# Altium footprint library LimeMicroAltiumLib_pcbLib_r05.PcbLib: 746 footprints (part 26 of 48)
Each footprint in its own frame and in the unit in brackets; x right, y up, seen from the top. Pads: shape width x height; smd on the part's side, far side on the other; paste and mask are expansions set on the pad; w line width, h text height; cw(c..) or ccw(c..) is an arc to the next point about the centre after c.
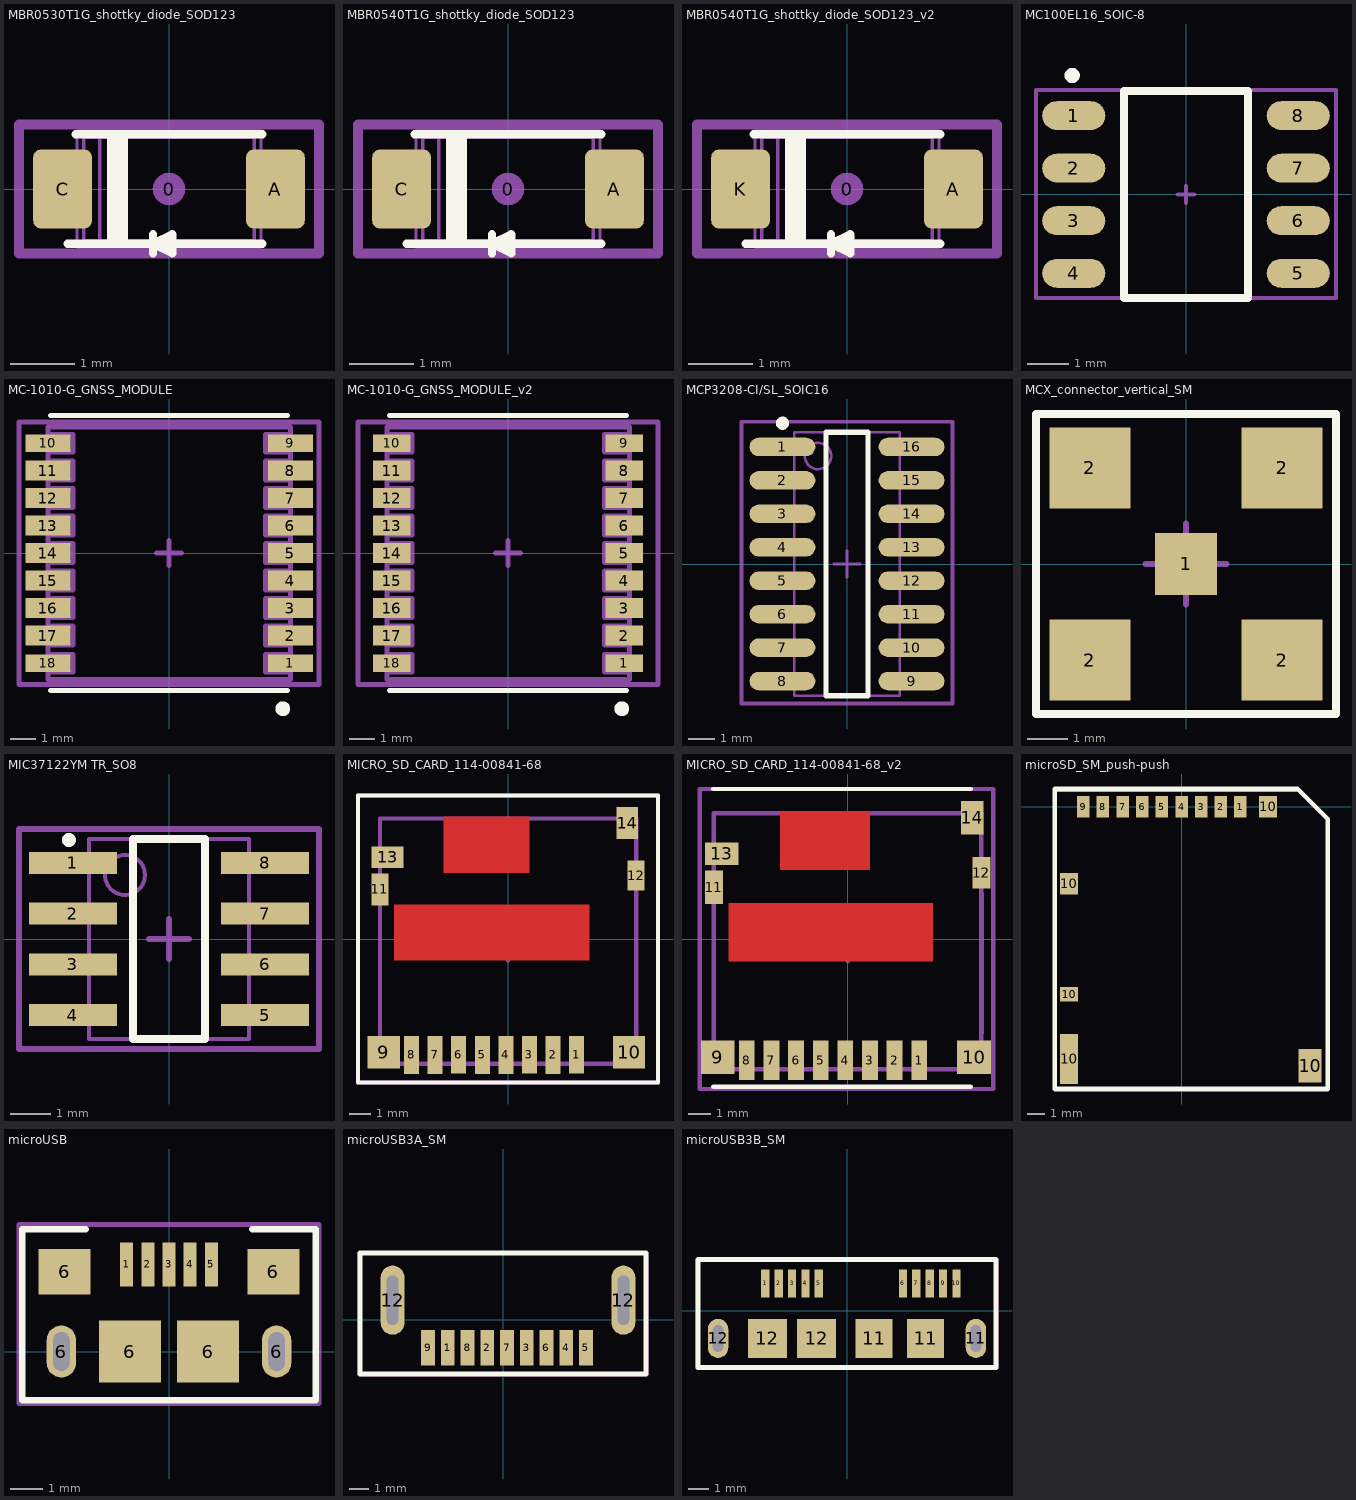
[diagram p25: the footprints below, top view; thin cyan lines are the x and y axes]

## MBR0530T1G_shottky_diode_SOD123 [mm]
height 1.15
pads (3):
  round 0.508 on Mech15: 0(0,0)
  rrect25% 0.91x1.22 smd: A(1.65,0) C(-1.65,0)
Top Overlay:
  lines w0.127: -1.575,-0.85 1.448,-0.85 ; -1.45,0.85 1.45,0.85 ; -0.9,-0.85 -0.9,0.85 ; -0.8,-0.85 -0.8,0.85 ; -0.7,-0.85 -0.7,0.85 ; -0.25,-1 -0.25,-0.7 ; 0.05,-0.85 -0.25,-0.85 ; -0.25,-0.85 0.05,-0.7 0.05,-1 -0.25,-0.85
Mechanical 13:
  lines w0.05: -1.766,-0.308 -1.766,0.308 ; -1.707,-0.308 -1.707,0.308 ; -1.517,-0.308 -1.517,0.308 ; -1.425,-0.308 -1.95,-0.308 -1.95,0.308 -1.425,0.308 ; 0.075,-0.9 0.177,-0.798 ; 1.425,-0.308 1.95,-0.308 1.95,0.308 1.425,0.308 ; 1.517,-0.308 1.517,0.308 ; 1.707,-0.308 1.707,0.308 ; 1.766,-0.308 1.766,0.308 ; -1.425,0.9 -1.425,-0.9 1.425,-0.9 ; -1.425,0.9 1.425,0.9 ; -1.425,0.9 -1.323,0.798 ; -1.323,0.798 -1.323,-0.798 -1.072,-0.798 ; -1.323,0.798 -1.072,0.798 ; -1.072,-0.798 -1.072,0.798 ; -1.072,-0.798 1.322,-0.797 ; -1.072,0.798 1.322,0.797 ; 1.322,-0.797 1.425,-0.9 ; 1.322,-0.797 1.322,0.797 ; 1.322,0.797 1.425,0.9 ; 1.425,-0.9 1.425,0.9
Mechanical 15:
  lines w0.15: -2.325,-1 -2.325,1 2.325,1 2.325,-1 -2.325,-1
  text ".Designator" at 0,0 h0.55
  text "C" at -1.9,-0.275 h0.55
  text "A" at 1.475,-0.275 h0.55
3D body "SOD123.STEP": height 1.18, standoff 0, extent -1.95,-0.9 1.95,0.9

## MBR0540T1G_shottky_diode_SOD123 [mm]
height 1.15
pads (3):
  round 0.508 on Mech15: 0(0,0)
  rrect25% 0.91x1.22 smd: A(1.65,0) C(-1.65,0)
Top Overlay:
  lines w0.127: -1.575,-0.85 1.448,-0.85 ; -1.45,0.85 1.45,0.85 ; -0.9,-0.85 -0.9,0.85 ; -0.8,-0.85 -0.8,0.85 ; -0.7,-0.85 -0.7,0.85 ; -0.25,-1 -0.25,-0.7 ; 0.05,-0.85 -0.25,-0.85 ; -0.25,-0.85 0.05,-0.7 0.05,-1 -0.25,-0.85
Mechanical 13:
  lines w0.05: -1.766,-0.308 -1.766,0.308 ; -1.707,-0.308 -1.707,0.308 ; -1.517,-0.308 -1.517,0.308 ; -1.425,-0.308 -1.95,-0.308 -1.95,0.308 -1.425,0.308 ; 0.075,-0.9 0.177,-0.798 ; 1.425,-0.308 1.95,-0.308 1.95,0.308 1.425,0.308 ; 1.517,-0.308 1.517,0.308 ; 1.707,-0.308 1.707,0.308 ; 1.766,-0.308 1.766,0.308 ; -1.425,0.9 -1.425,-0.9 1.425,-0.9 ; -1.425,0.9 1.425,0.9 ; -1.425,0.9 -1.323,0.798 ; -1.323,0.798 -1.323,-0.798 -1.072,-0.798 ; -1.323,0.798 -1.072,0.798 ; -1.072,-0.798 -1.072,0.798 ; -1.072,-0.798 1.322,-0.797 ; -1.072,0.798 1.322,0.797 ; 1.322,-0.797 1.425,-0.9 ; 1.322,-0.797 1.322,0.797 ; 1.322,0.797 1.425,0.9 ; 1.425,-0.9 1.425,0.9
Mechanical 15:
  lines w0.15: -2.325,-1 -2.325,1 2.325,1 2.325,-1 -2.325,-1
  text ".Designator" at 0,0 h0.55
  text "C" at -1.9,-0.275 h0.55
  text "A" at 1.475,-0.275 h0.55
3D body "SOD123.STEP": height 1.18, standoff 0, extent -1.95,-0.9 1.95,0.9

## MBR0540T1G_shottky_diode_SOD123_v2 [mm]
height 1.15
pads (3):
  round 0.508 on Mech15: 0(0,0)
  rrect25% 0.91x1.22 smd: A(1.65,0) K(-1.65,0)
Top Overlay:
  lines w0.127: -1.575,-0.85 1.448,-0.85 ; -1.45,0.85 1.45,0.85 ; -0.9,-0.85 -0.9,0.85 ; -0.8,-0.85 -0.8,0.85 ; -0.7,-0.85 -0.7,0.85 ; -0.25,-1 -0.25,-0.7 ; 0.05,-0.85 -0.25,-0.85 ; -0.25,-0.85 0.05,-1 0.05,-0.7 -0.25,-0.85
Mechanical 13:
  lines w0.05: -1.766,-0.308 -1.766,0.308 ; -1.707,-0.308 -1.707,0.308 ; -1.517,-0.308 -1.517,0.308 ; -1.425,-0.308 -1.95,-0.308 -1.95,0.308 -1.425,0.308 ; 0.075,-0.9 0.177,-0.798 ; 1.425,-0.308 1.95,-0.308 1.95,0.308 1.425,0.308 ; 1.517,-0.308 1.517,0.308 ; 1.707,-0.308 1.707,0.308 ; 1.766,-0.308 1.766,0.308 ; -1.425,0.9 -1.323,0.798 ; -1.425,0.9 1.425,0.9 ; -1.425,0.9 -1.425,-0.9 1.425,-0.9 ; -1.323,0.798 -1.072,0.798 ; -1.323,0.798 -1.323,-0.798 -1.072,-0.798 ; -1.072,-0.798 1.322,-0.797 ; -1.072,-0.798 -1.072,0.798 ; -1.072,0.798 1.322,0.797 ; 1.322,-0.797 1.322,0.797 ; 1.322,-0.797 1.425,-0.9 ; 1.322,0.797 1.425,0.9 ; 1.425,-0.9 1.425,0.9
Mechanical 15:
  lines w0.15: -2.325,-1 2.325,-1 2.325,1 -2.325,1 -2.325,-1
  text "A" at 1.475,-0.275 h0.55
  text "C" at -1.9,-0.275 h0.55
  text ".Designator" at 0,0 h0.55
3D body "SOD123.STEP": height 1.18, standoff 0, extent -1.95,-0.9 1.95,0.9

## MC100EL16_SOIC-8 [mm]
pads (8):
  oval 1.525x0.7 smd mask+0.05: 1(-2.712,1.905) 2(-2.712,0.635) 3(-2.712,-0.635) 4(-2.712,-1.905) 5(2.712,-1.905) 6(2.712,-0.635) 7(2.712,0.635) 8(2.712,1.905)
Top Overlay:
  circle w0.254: c-2.75,2.875 r0.056
  lines w0.2: -1.5,-2.5 1.5,-2.5 1.5,2.5 -1.5,2.5 -1.5,-2.5
Mechanical 15:
  circle w0.254: c-2.675,1.9 r0.071
  lines w0.1: -0.2,0 0,0 ; 0,-0.2 0,0 ; 0,0.2 0,0 ; 0.2,0 0,0 ; -3.625,-2.5 3.625,-2.5 3.625,2.525 -3.625,2.525 -3.625,-2.5
  text ".Designator" at 0,0 h0.55
3D body "MC100EL16DG.stp": height 1.75, standoff 0, extent -3,-2.45 3,2.45

## MC-1010-G_GNSS_MODULE [mm]
pads (18):
  rect 1.8x0.7 smd mask+0.05: 1(4.85,-4.4) 9(4.85,4.4) 10(-4.85,4.4) 18(-4.85,-4.4)
  rect 1.8x0.8 smd mask+0.05: 2(4.85,-3.3) 3(4.85,-2.2) 4(4.85,-1.1) 5(4.85,0) 6(4.85,1.1) 7(4.85,2.2) 8(4.85,3.3) 11(-4.85,3.3) 12(-4.85,2.2) 13(-4.85,1.1) 14(-4.85,0) 15(-4.85,-1.1) 16(-4.85,-2.2) 17(-4.85,-3.3)
Top Overlay:
  circle w0.3: c4.55,-6.225 r0.146
  lines w0.2: -4.75,-5.5 4.75,-5.5 ; -4.75,5.5 4.75,5.5
Mechanical 13:
  lines w0.2: -4.534,-4.434 cw(c-4.85,-4.434) -4.85,-4.75 -3.85,-4.75 -3.85,-4.05 -4.85,-4.05 cw(c-4.85,-4.366) -4.534,-4.366 ; -4.534,4.366 cw(c-4.85,4.366) -4.85,4.05 -3.85,4.05 -3.85,4.75 -4.85,4.75 cw(c-4.85,4.434) -4.534,4.434 ; 4.534,-4.434 ccw(c4.85,-4.434) 4.85,-4.75 3.85,-4.75 3.85,-4.05 4.85,-4.05 ccw(c4.85,-4.366) 4.534,-4.366 ; 4.534,4.366 ccw(c4.85,4.366) 4.85,4.05 3.85,4.05 3.85,4.75 4.85,4.75 ccw(c4.85,4.434) 4.534,4.434 ; -4.85,-5.05 4.85,-5.05 4.85,5.05 -4.85,5.05 -4.85,-5.05 ; -4.85,-3.675 ccw(c-4.85,-3.359) -4.534,-3.359 -4.534,-3.241 ccw(c-4.85,-3.241) -4.85,-2.925 -3.85,-2.925 -3.85,-3.675 -4.85,-3.675 ; -4.85,-2.575 ccw(c-4.85,-2.259) -4.534,-2.259 -4.534,-2.141 ccw(c-4.85,-2.141) -4.85,-1.825 -3.85,-1.825 -3.85,-2.575 -4.85,-2.575 ; -4.85,-1.475 ccw(c-4.85,-1.159) -4.534,-1.159 -4.534,-1.041 ccw(c-4.85,-1.041) -4.85,-0.725 -3.85,-0.725 -3.85,-1.475 -4.85,-1.475 ; -4.85,-0.375 ccw(c-4.85,-0.059) -4.534,-0.059 -4.534,0.059 ccw(c-4.85,0.059) -4.85,0.375 -3.85,0.375 -3.85,-0.375 -4.85,-0.375 ; -4.85,0.725 ccw(c-4.85,1.041) -4.534,1.041 -4.534,1.159 ccw(c-4.85,1.159) -4.85,1.475 -3.85,1.475 -3.85,0.725 -4.85,0.725 ; -4.85,1.825 ccw(c-4.85,2.141) -4.534,2.141 -4.534,2.259 ccw(c-4.85,2.259) -4.85,2.575 -3.85,2.575 -3.85,1.825 -4.85,1.825 ; -4.85,2.925 ccw(c-4.85,3.241) -4.534,3.241 -4.534,3.359 ccw(c-4.85,3.359) -4.85,3.675 -3.85,3.675 -3.85,2.925 -4.85,2.925 ; 3.85,-3.675 3.85,-2.925 4.85,-2.925 ccw(c4.85,-3.241) 4.534,-3.241 4.534,-3.359 ccw(c4.85,-3.359) 4.85,-3.675 3.85,-3.675 ; 3.85,-2.575 4.85,-2.575 cw(c4.85,-2.259) 4.534,-2.259 4.534,-2.141 cw(c4.85,-2.141) 4.85,-1.825 3.85,-1.825 3.85,-2.575 ; 3.85,-1.475 4.85,-1.475 cw(c4.85,-1.159) 4.534,-1.159 4.534,-1.041 cw(c4.85,-1.041) 4.85,-0.725 3.85,-0.725 3.85,-1.475 ; 3.85,-0.375 4.85,-0.375 cw(c4.85,-0.059) 4.534,-0.059 4.534,0.059 cw(c4.85,0.059) 4.85,0.375 3.85,0.375 3.85,-0.375 ; 3.85,0.725 3.85,1.475 4.85,1.475 ccw(c4.85,1.159) 4.534,1.159 4.534,1.041 ccw(c4.85,1.041) 4.85,0.725 3.85,0.725 ; 3.85,1.825 3.85,2.575 4.85,2.575 ccw(c4.85,2.259) 4.534,2.259 4.534,2.141 ccw(c4.85,2.141) 4.85,1.825 3.85,1.825 ; 3.85,2.925 4.85,2.925 cw(c4.85,3.241) 4.534,3.241 4.534,3.359 cw(c4.85,3.359) 4.85,3.675 3.85,3.675 3.85,2.925
Mechanical 15:
  lines w0.2: -0.5,0 0.5,0 ; 0,-0.5 0,0.5 ; -6,-5.25 -6,5.25 6,5.25 6,-5.25 -6,-5.25
  text ".Designator" at 0,0 h0.55
  text "1" at 4.75,-4.75 h0.55
  text "9" at 4.75,4.25 h0.55
  text "10" at -5.25,4.25 h0.55
  text "18" at -5.25,-4.75 h0.55
3D body: height 2, standoff 0, extent -4.85,-5.05 4.85,5.05

## MC-1010-G_GNSS_MODULE_v2 [mm]
pads (18):
  rect 1.5x0.7 smd mask+0.05: 1(4.65,-4.4) 9(4.65,4.4) 10(-4.65,4.4) 18(-4.65,-4.4)
  rect 1.5x0.8 smd mask+0.05: 2(4.65,-3.3) 3(4.65,-2.2) 4(4.65,-1.1) 5(4.65,0) 6(4.65,1.1) 7(4.65,2.2) 8(4.65,3.3) 11(-4.65,3.3) 12(-4.65,2.2) 13(-4.65,1.1) 14(-4.65,0) 15(-4.65,-1.1) 16(-4.65,-2.2) 17(-4.65,-3.3)
Top Overlay:
  circle w0.3: c4.55,-6.225 r0.146
  lines w0.2: -4.75,-5.5 4.75,-5.5 ; -4.75,5.5 4.75,5.5
Mechanical 13:
  lines w0.2: -4.534,-4.434 cw(c-4.85,-4.434) -4.85,-4.75 -3.85,-4.75 -3.85,-4.05 -4.85,-4.05 cw(c-4.85,-4.366) -4.534,-4.366 ; -4.534,4.366 cw(c-4.85,4.366) -4.85,4.05 -3.85,4.05 -3.85,4.75 -4.85,4.75 cw(c-4.85,4.434) -4.534,4.434 ; 4.534,-4.434 ccw(c4.85,-4.434) 4.85,-4.75 3.85,-4.75 3.85,-4.05 4.85,-4.05 ccw(c4.85,-4.366) 4.534,-4.366 ; 4.534,4.366 ccw(c4.85,4.366) 4.85,4.05 3.85,4.05 3.85,4.75 4.85,4.75 ccw(c4.85,4.434) 4.534,4.434 ; -4.85,-5.05 4.85,-5.05 4.85,5.05 -4.85,5.05 -4.85,-5.05 ; -4.85,-3.675 ccw(c-4.85,-3.359) -4.534,-3.359 -4.534,-3.241 ccw(c-4.85,-3.241) -4.85,-2.925 -3.85,-2.925 -3.85,-3.675 -4.85,-3.675 ; -4.85,-2.575 ccw(c-4.85,-2.259) -4.534,-2.259 -4.534,-2.141 ccw(c-4.85,-2.141) -4.85,-1.825 -3.85,-1.825 -3.85,-2.575 -4.85,-2.575 ; -4.85,-1.475 ccw(c-4.85,-1.159) -4.534,-1.159 -4.534,-1.041 ccw(c-4.85,-1.041) -4.85,-0.725 -3.85,-0.725 -3.85,-1.475 -4.85,-1.475 ; -4.85,-0.375 ccw(c-4.85,-0.059) -4.534,-0.059 -4.534,0.059 ccw(c-4.85,0.059) -4.85,0.375 -3.85,0.375 -3.85,-0.375 -4.85,-0.375 ; -4.85,0.725 ccw(c-4.85,1.041) -4.534,1.041 -4.534,1.159 ccw(c-4.85,1.159) -4.85,1.475 -3.85,1.475 -3.85,0.725 -4.85,0.725 ; -4.85,1.825 ccw(c-4.85,2.141) -4.534,2.141 -4.534,2.259 ccw(c-4.85,2.259) -4.85,2.575 -3.85,2.575 -3.85,1.825 -4.85,1.825 ; -4.85,2.925 ccw(c-4.85,3.241) -4.534,3.241 -4.534,3.359 ccw(c-4.85,3.359) -4.85,3.675 -3.85,3.675 -3.85,2.925 -4.85,2.925 ; 3.85,-3.675 3.85,-2.925 4.85,-2.925 ccw(c4.85,-3.241) 4.534,-3.241 4.534,-3.359 ccw(c4.85,-3.359) 4.85,-3.675 3.85,-3.675 ; 3.85,-2.575 4.85,-2.575 cw(c4.85,-2.259) 4.534,-2.259 4.534,-2.141 cw(c4.85,-2.141) 4.85,-1.825 3.85,-1.825 3.85,-2.575 ; 3.85,-1.475 4.85,-1.475 cw(c4.85,-1.159) 4.534,-1.159 4.534,-1.041 cw(c4.85,-1.041) 4.85,-0.725 3.85,-0.725 3.85,-1.475 ; 3.85,-0.375 4.85,-0.375 cw(c4.85,-0.059) 4.534,-0.059 4.534,0.059 cw(c4.85,0.059) 4.85,0.375 3.85,0.375 3.85,-0.375 ; 3.85,0.725 3.85,1.475 4.85,1.475 ccw(c4.85,1.159) 4.534,1.159 4.534,1.041 ccw(c4.85,1.041) 4.85,0.725 3.85,0.725 ; 3.85,1.825 3.85,2.575 4.85,2.575 ccw(c4.85,2.259) 4.534,2.259 4.534,2.141 ccw(c4.85,2.141) 4.85,1.825 3.85,1.825 ; 3.85,2.925 4.85,2.925 cw(c4.85,3.241) 4.534,3.241 4.534,3.359 cw(c4.85,3.359) 4.85,3.675 3.85,3.675 3.85,2.925
Mechanical 15:
  lines w0.2: -0.5,0 0.5,0 ; 0,-0.5 0,0.5 ; -6,-5.25 -6,5.25 6,5.25 6,-5.25 -6,-5.25
  text ".Designator" at 0,0 h0.55
  text "1" at 4.75,-4.75 h0.55
  text "9" at 4.75,4.25 h0.55
  text "10" at -5.25,4.25 h0.55
  text "18" at -5.25,-4.75 h0.55
3D body: height 2, standoff 0, extent -4.85,-5.05 4.85,5.05

## MCP3208-CI/SL_SOIC16 [mm] "SOIC, 16-Leads, Body 9.9x3.9mm, Pitch 1.27mm, IPC Low Density"
height 1.75
pads (16):
  oval 2.5x0.7 smd: 1(-2.45,4.445) 2(-2.45,3.175) 3(-2.45,1.905) 4(-2.45,0.635) 5(-2.45,-0.635) 6(-2.45,-1.905) 7(-2.45,-3.175) 8(-2.45,-4.445) 9(2.45,-4.445) 10(2.45,-3.175) 11(2.45,-1.905) 12(2.45,-0.635) 13(2.45,0.635) 14(2.45,1.905) 15(2.45,3.175) 16(2.45,4.445)
Top Overlay:
  circle w0.25: c-2.45,5.345 r0.125
  lines w0.2: -0.8,-5 0.8,-5 0.8,5 -0.8,5 -0.8,-5
Mechanical 13:
  circle w0.1: c-1.1,4.1 r0.5
  lines w0.1: -2,-5 2,-5 2,5 -2,5 -2,-5
Mechanical 15:
  circle w0.2: c-2.5,4.5 r0.09
  lines w0.1: -0.5,0 0.5,0 ; 0,-0.5 0,0.5
  lines w0.15: -4,-5.3 4,-5.3 4,5.4 -4,5.4 -4,-5.3
  text ".Designator" at 0,0 h0.55
3D body "User Library-SOIC-16-1.step": height 1.4, standoff 0, extent -3,-4.95 3,4.95

## MCX_connector_vertical_SM [mm]
pads (5):
  rect 1.52x1.52 smd: 1(0,0)
  rect 2x2 smd: 2(-2.37,-2.37) 2(-2.37,2.37) 2(2.37,-2.37) 2(2.37,2.37)
Top Overlay:
  lines w0.2: -3.7,-3.7 -3.7,3.7 3.7,3.7 3.7,-3.7 -3.7,-3.7
Mechanical 15:
  lines w0.15: -1,0 0,0 ; 0,-1 0,0 ; 0,1 0,0 ; 1,0 0,0 ; -3.7,-3.7 3.7,-3.7 3.7,3.7 -3.7,3.7 -3.7,-3.7
  text ".Designator" at 0,0 h0.55
3D body "User Library-MCX_SMD_v1.step": height 5.9, standoff 0, extent -2.95,-2.95 2.95,2.95

## MECH_JUMPER_HALF_PITCH [mm]
3D body "User Library-PinHeader50mil.STEP": height 7.3, standoff 1.8, extent -1.25,-0.575 1.25,0.625

## MIC37122YM TR_SO8 [mm] "SOIC, 8-Leads, Body 4,90x3,90mm, Pitch 1,27mm, IPC Medium Density"
height 1.7
pads (8):
  rect 2.2x0.55 smd: 1(-2.4,1.905) 2(-2.4,0.635) 3(-2.4,-0.635) 4(-2.4,-1.905) 5(2.4,-1.905) 6(2.4,-0.635) 7(2.4,0.635) 8(2.4,1.905)
Top Overlay:
  circle w0.25: c-2.5,2.475 r0.05
  lines w0.2: -0.9,-2.5 0.9,-2.5 0.9,2.5 -0.9,2.5 -0.9,-2.5
Mechanical 13:
  circle w0.1: c-1.1,1.6 r0.5
  lines w0.1: -2,-2.5 2,-2.5 2,2.5 -2,2.5 -2,-2.5
Mechanical 15:
  circle w0.35: c-2.8,1.9 r0.1
  lines w0.15: -0.5,0 0.5,0 ; 0,-0.5 0,0.5 ; -3.75,-2.75 3.75,-2.75 3.75,2.75 -3.75,2.75 -3.75,-2.75
  text ".Designator" at 0,0 h0.55
3D body "CircuitWorks-SO-8.step": height 1.45, standoff 0, extent -2.889,-2.45 2.889,2.452

## MICRO_SD_CARD_114-00841-68 [mm]
pads (14):
  rect 0.7x1.75 smd mask+0.1: 1(3.2,-5.412) 6(-2.3,-5.412)
  rect 0.701x1.753 smd mask+0.1: 2(2.1,-5.412) 8(-4.5,-5.412)
  rect 0.701x1.752 smd mask+0.1: 3(1,-5.412) 4(-0.1,-5.412) 5(-1.2,-5.412) 7(-3.4,-5.412)
  rect 1.501x1.501 smd mask+0.1: 9(-5.8,-5.288)
  rect 1.502x1.502 smd mask+0.1: 10(5.65,-5.288)
  rect 0.801x1.501 smd mask+0.1: 11(-5.975,2.312)
  rect 0.8x1.401 smd mask+0.1: 12(5.975,2.963)
  rect 1.5x1 smd mask+0.1: 13(-5.62,3.812)
  rect 1.001x1.502 smd mask+0.1: 14(5.575,5.413)
Top Layer:
  pour cut-out: 1,3.1 -3,3.1 -3,5.7 1,5.7
  pour cut-out: 3.8,-1 -5.3,-1 -5.3,1.6 3.8,1.6
Top Overlay:
  lines w0.2: -7,-6.7 7,-6.7 7,6.7 -7,6.7 -7,-6.7
Top Solder:
  region: -6.475,3.15 -6.475,4.425 -4.75,4.425 -4.75,3.2 -5.475,3.2 -5.475,3.15
Mechanical 13:
  lines w0.2: -5.975,-5.841 -5.975,5.626 ; -5.975,-5.826 5.976,-5.826 ; -5.975,-4.145 -5.975,-0.109 ; -5.975,-0.104 -5.975,1.237 ; 4.656,5.626 -5.975,5.626 ; 5.982,-5.831 5.982,5.626 ; 5.985,-4.215 5.985,-0.104 ; 5.988,-0.105 5.988,2.043 ; 5.988,5.626 -5.975,5.626
Mechanical 15:
  lines w0.2: -1,0 0,0 ; 0,-1 0,0 ; 0,1 0,0 ; 1,0 0,0 ; -7,-6.7 7,-6.7 7,6.7 -7,6.7 -7,-6.7
  text "8" at -4.6,-4.4 h0.55
  text "1" at 3.1,-4.4 h0.55
  text ".Designator" at 0,0 h0.55
3D body "User Library-Micro_SD.step": height 1.45, standoff 0.47, extent -5.5,-9.9 5.5,5.1
3D body "User Library-Micro SD Holder 114-00841-68.step": height 1.6, standoff 0, extent -6,-5.85 6,5.75

## MICRO_SD_CARD_114-00841-68_v2 [mm]
pads (14):
  rect 0.7x1.75 smd mask+0.1: 1(3.2,-5.412) 6(-2.3,-5.412)
  rect 0.701x1.753 smd mask+0.1: 2(2.1,-5.412) 8(-4.5,-5.412)
  rect 0.701x1.752 smd mask+0.1: 3(1,-5.412) 4(-0.1,-5.412) 5(-1.2,-5.412) 7(-3.4,-5.412)
  rect 1.501x1.501 smd mask+0.1: 9(-5.8,-5.288)
  rect 1.502x1.502 smd mask+0.1: 10(5.65,-5.288)
  rect 0.801x1.501 smd mask+0.1: 11(-5.975,2.312)
  rect 0.8x1.401 smd mask+0.1: 12(5.975,2.963)
  rect 1.5x1 smd mask+0.1: 13(-5.62,3.812)
  rect 1.001x1.502 smd mask+0.1: 14(5.575,5.413)
Top Layer:
  pour cut-out: 1,3.1 -3,3.1 -3,5.7 1,5.7
  pour cut-out: 3.8,-1 -5.3,-1 -5.3,1.6 3.8,1.6
Top Overlay:
  lines w0.2: -6,-6.6 5.5,-6.6 ; -6,6.7 5.5,6.7
Top Solder:
  region: -6.475,3.15 -6.475,4.425 -4.75,4.425 -4.75,3.2 -5.475,3.2 -5.475,3.15
Mechanical 13:
  lines w0.2: -5.975,-5.841 -5.975,5.626 ; -5.975,-5.826 5.976,-5.826 ; -5.975,-4.145 -5.975,-0.109 ; -5.975,-0.104 -5.975,1.237 ; 4.656,5.626 -5.975,5.626 ; 5.982,-5.831 5.982,5.626 ; 5.985,-4.215 5.985,-0.104 ; 5.988,-0.105 5.988,2.043 ; 5.988,5.626 -5.975,5.626
Mechanical 15:
  lines w0.2: -1,0 0,0 ; 0,-1 0,0 ; 0,1 0,0 ; 1,0 0,0 ; -6.6,-6.7 -6.6,6.7 6.5,6.7 6.5,-6.7 -6.6,-6.7
  text "8" at -4.6,-4.4 h0.55
  text "1" at 3.1,-4.4 h0.55
  text ".Designator" at 0,0 h0.55
3D body "User Library-Micro_SD.step": height 1.45, standoff 0.47, extent -5.5,-9.9 5.5,5.1
3D body "User Library-Micro SD Holder 114-00841-68.step": height 1.6, standoff 0, extent -6,-5.85 6,5.75

## microSD_SM_push-push [mm]
pads (14):
  rect 0.7x1.2 smd: 1(3.3,0) 2(2.2,0) 3(1.1,0) 4(0,0) 5(-1.1,0) 6(-2.2,0) 7(-3.3,0) 8(-4.4,0) 9(-5.5,0)
  rect 1x2.8 smd: 10(-6.3,-14.11)
  rect 1x0.8 smd: 10(-6.3,-10.5)
  rect 1x1.2 smd: 10(-6.3,-4.3) 10(4.85,0)
  rect 1.3x1.9 smd: 10(7.2,-14.5)
Top Overlay:
  lines w0.254: -7.1,-15.8 -7.1,1 6.5,1 8.2,-0.7 8.2,-15.8 -7.1,-15.8
Mechanical 15:
  lines w0.15: -7.1,-15.8 -7.1,1 -7,0.9 6.625,0.9 8.2,-0.675 8.2,-15.8 -7.1,-15.8
  text ".Designator" at 0.4,-8.1 h0.55
3D body "DM3AT-SF-PEJM5.stp": height 1.68, standoff 0, extent -6.425,-16.1 7.425,0.05
3D body "User Library-Micro_SD.step": height 1.45, standoff 0.47, extent -5.5,-17.3 5.5,-2.3

## microUSB [mm]
pads (11):
  rect 0.4x1.35 smd mask+0.05: 1(-1.3,2.675) 2(-0.65,2.675) 3(0,2.675) 4(0.65,2.675) 5(1.3,2.675)
  oval 0.9x1.6 hole 0.5 slot 1.2 at 90 deg: 6(-3.3,0) 6(3.3,0)
  rect 1.6x1.4 smd: 6(-3.2,2.45) 6(3.2,2.45)
  rect 1.9x1.9 smd: 6(-1.2,0) 6(1.2,0)
Top Overlay:
  lines w0.2: -2.55,3.75 -4.5,3.75 -4.5,-1.5 4.5,-1.5 4.5,3.75 2.55,3.75
Mechanical 15:
  lines w0.15: -4.6,-1.6 -4.6,3.9 4.6,3.9 4.6,-1.6 -4.6,-1.6
  text ".Designator" at 0,1.3 h0.55
3D body "USB3090-30-A_revE.step": height 2.59, standoff -1, extent -3.891,-2.565 3.892,2.925

## microUSB3A_SM [mm]
pads (11):
  rect 0.7x1.8 smd: 1(-2.8,-1.4) 2(-0.8,-1.4) 3(1.2,-1.4) 4(3.2,-1.4) 5(4.2,-1.4) 6(2.2,-1.4) 7(0.2,-1.4) 8(-1.8,-1.4) 9(-3.8,-1.4)
  oval 1.2x3.5 hole 0.6 slot 2.5 at 90 deg: 12(-5.6,1) 12(6.1,1)
Top Overlay:
  lines w0.254: -7.25,-2.75 -7.25,3.4 7.25,3.4 7.25,-2.75 -7.25,-2.75
Mechanical 15:
  lines w0.15: -7.3,-2.8 -7.3,3.4 7.3,3.4 7.3,-2.8 -7.3,-2.8
  text ".Designator" at 0,0.1 h0.55
3D body "692112030100.stp": height 1.8, standoff -2.7, extent -5.8,-1.954 6.2,18.8

## microUSB3B_SM [mm]
pads (16):
  rect 0.4x1.35 smd mask+0.05: 1(-3.975,1.338) 2(-3.325,1.338) 3(-2.675,1.338) 4(-2.025,1.338) 5(-1.375,1.338) 6(2.725,1.338) 7(3.375,1.338) 8(4.025,1.338) 9(4.675,1.338) 10(5.325,1.338)
  rect 1.8x1.9 smd: 11(1.325,-1.338) 11(3.825,-1.338)
  oval 1x1.9 hole 0.5 slot 1.3 at 90 deg: 11(6.275,-1.338) 12(-6.275,-1.338)
  rect 1.9x1.9 smd: 12(-3.875,-1.338) 12(-1.475,-1.338)
Top Overlay:
  lines w0.254: -7.25,-2.75 -7.25,2.5 7.25,2.5 7.25,-2.75 -7.25,-2.75
Mechanical 15:
  lines w0.15: -7.3,-2.8 -7.3,2.5 7.3,2.5 7.3,-2.8 -7.3,-2.8
  text ".Designator" at 0,0.1 h0.55
3D body "USB3110-30-A_revF.step": height 2.73, standoff -1, extent -6.707,-4.118 6.707,1.8